# Altium footprint library TranDangKhoa-LIB.PcbLib: 1435 footprints (part 8 of 90)
Each footprint in its own frame and in the unit in brackets; x right, y up, seen from the top. Pads: shape width x height; smd on the part's side, far side on the other; paste and mask are expansions set on the pad; w line width, h text height; cw(c..) or ccw(c..) is an arc to the next point about the centre after c.
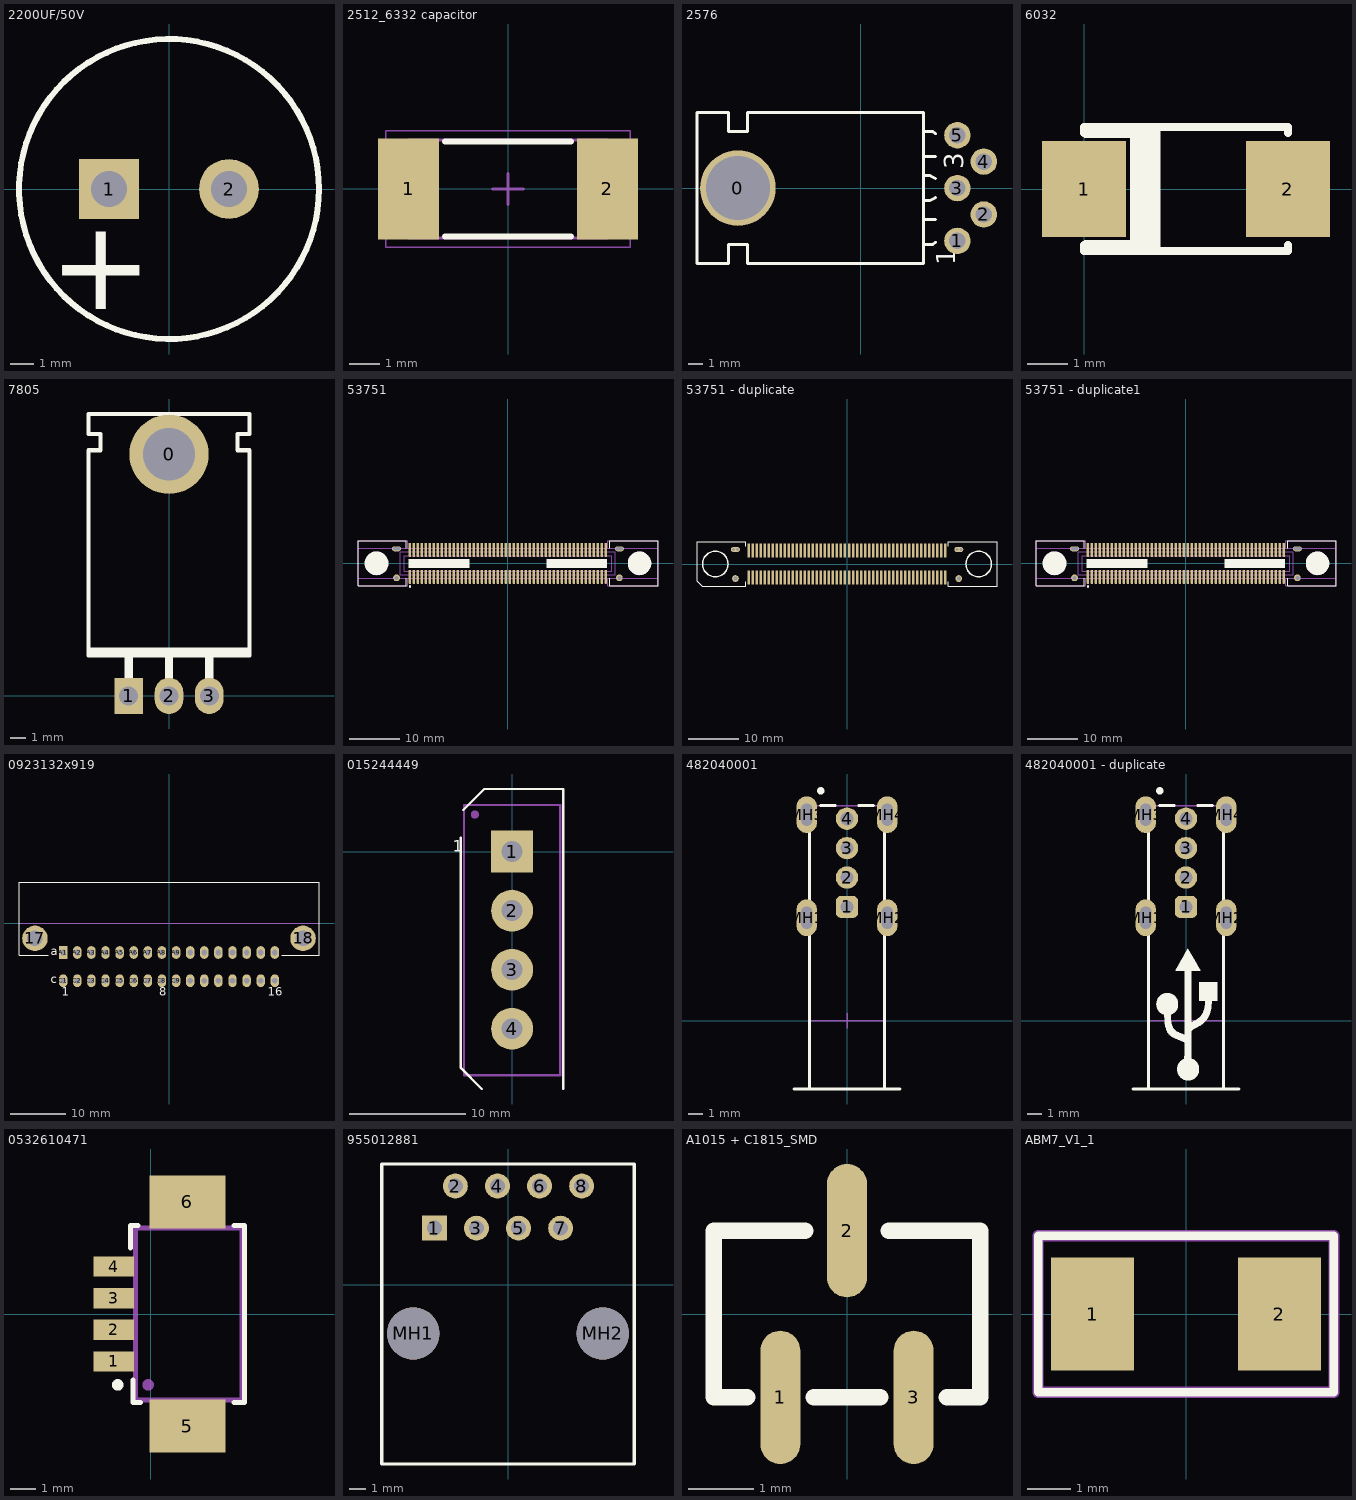
[diagram p7: the footprints below, top view; thin cyan lines are the x and y axes]

## 2200UF/50V [mil]
pads (2):
  rect 100x100 hole 60: 1(-100,0)
  round 100 hole 60: 2(100,0)
Top Overlay:
  circle w10: c0,0 r250
  text "+" at -200,-200 h150

## 2512_6332 capacitor [mm] "Chip Capacitor, 2-Leads, Body 6.50x3.20mm, IPC Medium Density"
height 0.65
pads (2):
  rect 2x3.3 smd: 1(-3.25,0) 2(3.25,0)
Top Overlay:
  lines w0.2: -2.05,-1.55 2.05,-1.55 ; -2.05,1.55 2.05,1.55
Mechanical 13:
  lines w0.1: -3.25,-1.6 -3.25,1.6 3.25,1.6 3.25,-1.6 -3.25,-1.6
Mechanical 15:
  lines w0.05: -4,-1.9 -4,1.9 4,1.9 4,-1.9 -4,-1.9
  lines w0.1: -0.5,0 0.5,0 ; 0,-0.5 0,0.5
3D body: height 0.65, standoff 0, extent -2.45,-1.6 2.45,1.6
3D body: height 0.65, standoff 0, extent -3.25,-1.6 -2.45,1.6
3D body: height 0.65, standoff 0, extent 2.45,-1.6 3.25,1.6

## 2576 [mil]
pads (6):
  round 200 hole 170: 0(-325.83,0)
  round 70 hole 43.31: 1(255.83,-140) 2(325.83,-70) 3(255.83,0) 4(325.83,70) 5(255.83,140)
Top Overlay:
  lines w7.87: 165.83,-150 190.83,-150 ; 165.83,-83.33 198.44,-83.33 ; 165.83,-33.33 182.5,-33.33 198.44,-25 ; 165.83,33.33 182.5,33.33 198.44,25 ; 165.83,83.33 198.44,83.33 ; 165.83,150 190.83,150 ; 189.89,150.31 198.44,143.9 ; 192.09,-148.11 198.44,-143.58 ; -434.17,-200 -434.17,200 -350.84,200 -350.84,150 -300.84,150 -300.84,200 165.83,200 165.83,-200 -300.84,-200 -300.84,-150 -350.84,-150 -350.84,-200 -434.17,-200
  text "3" at 270.83,50 h50
  text "1" at 250.83,-205 h50

## 6032 [mm] "SMD"
height 2.5
pads (2):
  rect 2.1x2.4 smd: 1(0,0) 2(5.08,0)
Top Overlay:
  rectangle: 0,-1.55 1.27,-1.27
  rectangle: 0,1.27 1.27,1.55
  rectangle: 1.143,-1.55 1.905,1.55
  lines w0.2: 0,-1.397 0,-1.55 5.08,-1.55 5.08,-1.397 ; 0,1.397 0,1.55 5.08,1.55 5.08,1.397

## 7805 [mm] "TO, Thru-Hole, Vertical, Heatsink Mounted; 3 In-Line Leads; Pitch 2.54 mm; Pin sequence 1, 3, 2"
height 16.4
pads (4):
  round 5 hole 3.3: 0(0,15.24)
  rect 1.8x2.286 hole 1.2: 1(-2.54,0)
  oval 1.8x2.286 hole 1.2: 2(0,0) 3(2.54,0)
Top Overlay:
  circle w0.203: c0,15.24 r1.27
  rectangle: -0.254,0.762 0.254,2.54
  region: 2.794,2.54 2.286,2.54 2.286,0.762 2.794,0.762
  rectangle: -2.794,0.762 -2.286,2.54
  rectangle: -5.08,2.54 5.08,3.048
  lines w0.254: -5.08,2.54 -5.08,15.494 -4.318,15.494 -4.318,16.51 -5.08,16.51 -5.08,17.78 5.08,17.78 5.08,16.51 4.318,16.51 4.318,15.494 5.08,15.494 5.08,2.54 -5.08,2.54

## 53751 [mm]
pads (104):
  rrect50% 0.508x2.8 smd: 1(-19.6,-2.7) 2(-19.6,2.7) 3(-18.8,-2.7) 4(-18.8,2.7) 5(-18,-2.7) 6(-18,2.7) 7(-17.2,-2.7) 8(-17.2,2.7) 9(-16.4,-2.7) 10(-16.4,2.7) 11(-15.6,-2.7) 12(-15.6,2.7) 13(-14.8,-2.7) 14(-14.8,2.7) 15(-14,-2.7) 16(-14,2.7) 17(-13.2,-2.7) 18(-13.2,2.7) 19(-12.4,-2.7) 20(-12.4,2.7) 21(-11.6,-2.7) 22(-11.6,2.7) 23(-10.8,-2.7) 24(-10.8,2.7) 25(-10,-2.7) 26(-10,2.7) 27(-9.2,-2.7) 28(-9.2,2.7) 29(-8.4,-2.7) 30(-8.4,2.7) 31(-7.6,-2.7) 32(-7.6,2.7) 33(-6.8,-2.7) 34(-6.8,2.7) 35(-6,-2.7) 36(-6,2.7) 37(-5.2,-2.7) 38(-5.2,2.7) 39(-4.4,-2.7) 40(-4.4,2.7) 41(-3.6,-2.7) 42(-3.6,2.7) 43(-2.8,-2.7) 44(-2.8,2.7) 45(-2,-2.7) 46(-2,2.7) 47(-1.2,-2.7) 48(-1.2,2.7) 49(-0.4,-2.7) 50(-0.4,2.7) 51(0.4,-2.7) 52(0.4,2.7) 53(1.2,-2.7) 54(1.2,2.7) 55(2,-2.7) 56(2,2.7) 57(2.8,-2.7) 58(2.8,2.7) 59(3.6,-2.7) 60(3.6,2.7) 61(4.4,-2.7) 62(4.4,2.7) 63(5.2,-2.7) 64(5.2,2.7) 65(6,-2.7) 66(6,2.7) 67(6.8,-2.7) 68(6.8,2.7) 69(7.6,-2.7) 70(7.6,2.7) 71(8.4,-2.7) 72(8.4,2.7) 73(9.2,-2.7) 74(9.2,2.7) 75(10,-2.7) 76(10,2.7) 77(10.8,-2.7) 78(10.8,2.7) 79(11.6,-2.7) 80(11.6,2.7) 81(12.4,-2.7) 82(12.4,2.7) 83(13.2,-2.7) 84(13.2,2.7) 85(14,-2.7) 86(14,2.7) 87(14.8,-2.7) 88(14.8,2.7) 89(15.6,-2.7) 90(15.6,2.7) 91(16.4,-2.7) 92(16.4,2.7) 93(17.2,-2.7) 94(17.2,2.7) 95(18,-2.7) 96(18,2.7) 97(18.8,-2.7) 98(18.8,2.7) 99(19.6,-2.7) 100(19.6,2.7)
  round 1.35 hole 0.8: MH1(-22.283,-2.9) MH3(22.317,-2.9)
  oval 1.8x1 hole 0.6 slot 1.4 at 0 deg: MH2(-22.283,2.9) MH4(22.317,2.9)
Top Overlay:
  circle w2.7: c26.35,0 r1
  circle w2.76: c-26.3,0 r1
  circle w0.25: c-19.6,-4.65 r0.125
  rectangle: -19.85,-0.9 -7.7,0.9
  region: 19.85,0.9 7.7,0.9 7.7,-0.9 19.85,-0.9
  lines w0.2: -20.3,-3 -20.3,-4.5 -30,-4.5 -30,4.5 -20.3,4.5 -20.3,3 ; 20.35,-3 20.35,-4.5 30.05,-4.5 30.05,4.5 20.35,4.5 20.35,3
Mechanical 7:
  circle w0.127: c26.3,0 r2.25
  circle w0.127: c-26.3,0 r2.25
  lines w0.127: -20,-3 -20,-4.5 -30,-4.5 -30,-3 ; -20,3 -20,4.5 -30,4.5 -30,3 ; 20,-3 20,-4.5 30,-4.5 30,-3 ; 20,3 20,4.5 30,4.5 30,3 ; -30,-3 30,-3 ; -30,-3 -30,3 ; -30,3 30,3 ; 30,-3 30,3 ; -21.5,-2.3 21.5,-2.3 21.5,2.3 -21.5,2.3 -21.5,-2.3 ; -20.75,-1.55 -20.75,1.55 20.75,1.55 20.75,-1.55 -20.75,-1.55
3D body "53751 - 1009 Plug.stp": height 11.7, standoff -2.4, extent -30.332,-4.4 30.368,4.4

## 53751 - duplicate [mm] "Connector; Docking Station, Plug; 100 Position; Vertical"
height 7.63
pads (108):
  rect 0.5x2.8 smd: 1(-19.6,-2.7) 2(-19.6,2.7) 3(-18.8,-2.7) 4(-18.8,2.7) 5(-18,-2.7) 6(-18,2.7) 7(-17.2,-2.7) 8(-17.2,2.7) 9(-16.4,-2.7) 10(-16.4,2.7) 11(-15.6,-2.7) 12(-15.6,2.7) 13(-14.8,-2.7) 14(-14.8,2.7) 15(-14,-2.7) 16(-14,2.7) 17(-13.2,-2.7) 18(-13.2,2.7) 19(-12.4,-2.7) 20(-12.4,2.7) 21(-11.6,-2.7) 22(-11.6,2.7) 23(-10.8,-2.7) 24(-10.8,2.7) 25(-10,-2.7) 26(-10,2.7) 27(-9.2,-2.7) 28(-9.2,2.7) 29(-8.4,-2.7) 30(-8.4,2.7) 31(-7.6,-2.7) 32(-7.6,2.7) 33(-6.8,-2.7) 34(-6.8,2.7) 35(-6,-2.7) 36(-6,2.7) 37(-5.2,-2.7) 38(-5.2,2.7) 39(-4.4,-2.7) 40(-4.4,2.7) 41(-3.6,-2.7) 42(-3.6,2.7) 43(-2.8,-2.7) 44(-2.8,2.7) 45(-2,-2.7) 46(-2,2.7) 47(-1.2,-2.7) 48(-1.2,2.7) 49(-0.4,-2.7) 50(-0.4,2.7) 51(0.4,-2.7) 52(0.4,2.7) 53(1.2,-2.7) 54(1.2,2.7) 55(2,-2.7) 56(2,2.7) 57(2.8,-2.7) 58(2.8,2.7) 59(3.6,-2.7) 60(3.6,2.7) 61(4.4,-2.7) 62(4.4,2.7) 63(5.2,-2.7) 64(5.2,2.7) 65(6,-2.7) 66(6,2.7) 67(6.8,-2.7) 68(6.8,2.7) 69(7.6,-2.7) 70(7.6,2.7) 71(8.4,-2.7) 72(8.4,2.7) 73(9.2,-2.7) 74(9.2,2.7) 75(10,-2.7) 76(10,2.7) 77(10.8,-2.7) 78(10.8,2.7) 79(11.6,-2.7) 80(11.6,2.7) 81(12.4,-2.7) 82(12.4,2.7) 83(13.2,-2.7) 84(13.2,2.7) 85(14,-2.7) 86(14,2.7) 87(14.8,-2.7) 88(14.8,2.7) 89(15.6,-2.7) 90(15.6,2.7) 91(16.4,-2.7) 92(16.4,2.7) 93(17.2,-2.7) 94(17.2,2.7) 95(18,-2.7) 96(18,2.7) 97(18.8,-2.7) 98(18.8,2.7) 99(19.6,-2.7) 100(19.6,2.7)
  round 1.35 hole 0.8: MH1(-22.283,-2.9) MH3(22.317,-2.9)
  oval 1.8x1 all layers, no hole: MH2(-22.283,2.9) MH4(22.317,2.9)
  round 0.7 hole 0.6: MH2A(-22.683,2.9) MH2B(-21.883,2.9) MH4A(21.917,2.9) MH4B(22.717,2.9)
Top Overlay:
  circle w0.254: c26.3,0 r2.55
  circle w0.254: c-26.3,0 r2.55
  lines w0.2: -20.253,-4.45 -28.9,-4.45 -29.95,-3.4 -29.95,4.45 -20.25,4.45 -20.25,3.55 ; -20.25,-4.45 -20.25,-3.55 ; 20.25,-3.55 20.25,-4.45 29.95,-4.45 29.95,4.45 20.25,4.45 20.25,3.55
Drill Guide:
  text "Alert PCB fab to slot details" at -20.447,-3.302 h1.5
  text "Slot outline on Mech layer 1" at -19.812,1.778 h1.5
  text "Assign Keep-Out area to slot" at -22.352,-0.762 h1.5
Mechanical 2:
  lines w0.6: -22.683,2.9 -21.883,2.9 ; 21.917,2.9 22.717,2.9

## 53751 - duplicate1 [mm]
pads (104):
  rrect50% 0.508x2.8 smd mask+0: 1(-19.6,-2.7) 3(-18.8,-2.7) 5(-18,-2.7) 95(18,-2.7) 97(18.8,-2.7) 99(19.6,-2.7)
  rrect50% 0.508x2.8 smd: 2(-19.6,2.7) 4(-18.8,2.7) 6(-18,2.7) 7(-17.2,-2.7) 8(-17.2,2.7) 9(-16.4,-2.7) 10(-16.4,2.7) 11(-15.6,-2.7) 12(-15.6,2.7) 13(-14.8,-2.7) 14(-14.8,2.7) 15(-14,-2.7) 16(-14,2.7) 17(-13.2,-2.7) 18(-13.2,2.7) 19(-12.4,-2.7) 20(-12.4,2.7) 21(-11.6,-2.7) 22(-11.6,2.7) 23(-10.8,-2.7) 24(-10.8,2.7) 25(-10,-2.7) 26(-10,2.7) 27(-9.2,-2.7) 28(-9.2,2.7) 29(-8.4,-2.7) 30(-8.4,2.7) 31(-7.6,-2.7) 32(-7.6,2.7) 33(-6.8,-2.7) 34(-6.8,2.7) 35(-6,-2.7) 36(-6,2.7) 37(-5.2,-2.7) 38(-5.2,2.7) 39(-4.4,-2.7) 40(-4.4,2.7) 41(-3.6,-2.7) 42(-3.6,2.7) 43(-2.8,-2.7) 44(-2.8,2.7) 45(-2,-2.7) 46(-2,2.7) 47(-1.2,-2.7) 48(-1.2,2.7) 49(-0.4,-2.7) 50(-0.4,2.7) 51(0.4,-2.7) 52(0.4,2.7) 53(1.2,-2.7) 54(1.2,2.7) 55(2,-2.7) 56(2,2.7) 57(2.8,-2.7) 58(2.8,2.7) 59(3.6,-2.7) 60(3.6,2.7) 61(4.4,-2.7) 62(4.4,2.7) 63(5.2,-2.7) 64(5.2,2.7) 65(6,-2.7) 66(6,2.7) 67(6.8,-2.7) 68(6.8,2.7) 69(7.6,-2.7) 70(7.6,2.7) 71(8.4,-2.7) 72(8.4,2.7) 73(9.2,-2.7) 74(9.2,2.7) 75(10,-2.7) 76(10,2.7) 77(10.8,-2.7) 78(10.8,2.7) 79(11.6,-2.7) 80(11.6,2.7) 81(12.4,-2.7) 82(12.4,2.7) 83(13.2,-2.7) 84(13.2,2.7) 85(14,-2.7) 86(14,2.7) 87(14.8,-2.7) 88(14.8,2.7) 89(15.6,-2.7) 90(15.6,2.7) 91(16.4,-2.7) 92(16.4,2.7) 93(17.2,-2.7) 94(17.2,2.7) 96(18,2.7) 98(18.8,2.7) 100(19.6,2.7)
  round 1.35 hole 0.8 mask+0: MH1(-22.283,-2.9) MH3(22.317,-2.9)
  oval 1.8x1 hole 0.6 slot 1.4 at 0 deg mask+0: MH2(-22.283,2.9) MH4(22.317,2.9)
Top Overlay:
  circle w2.7: c26.35,0 r1
  circle w2.76: c-26.3,0 r1
  circle w0.25: c-19.6,-4.65 r0.125
  rectangle: -19.85,-0.9 -7.7,0.9
  region: 19.85,0.9 7.7,0.9 7.7,-0.9 19.85,-0.9
  lines w0.2: -20.3,-3 -20.3,-4.5 -30,-4.5 -30,4.5 -20.3,4.5 -20.3,3 ; 20.35,-3 20.35,-4.5 30.05,-4.5 30.05,4.5 20.35,4.5 20.35,3
Mechanical 7:
  circle w0.127: c26.3,0 r2.25
  circle w0.127: c-26.3,0 r2.25
  lines w0.127: -20,-3 -20,-4.5 -30,-4.5 -30,-3 ; -20,3 -20,4.5 -30,4.5 -30,3 ; 20,-3 20,-4.5 30,-4.5 30,-3 ; 20,3 20,4.5 30,4.5 30,3 ; -30,-3 30,-3 ; -30,-3 -30,3 ; -30,3 30,3 ; 30,-3 30,3 ; -21.5,-2.3 21.5,-2.3 21.5,2.3 -21.5,2.3 -21.5,-2.3 ; -20.75,-1.55 -20.75,1.55 20.75,1.55 20.75,-1.55 -20.75,-1.55
3D body "53751 - 1009 Plug.stp": height 11.7, standoff -2.4, extent -30.332,-4.4 30.368,4.4

## 0923132x919 [mm] "Connector; DIN 41612, Type 2C, Thru-Hole; Rows a+c, 32 Position; Right Angle"
height 11.1
pads (34):
  round 4.6 hole 2.8: 17(-24.13,-2.76) 18(24.13,-2.76)
  rect 1.524x2.286 hole 1: A1(-19.05,-5.3)
  oval 1.524x2.286 hole 1: A2(-16.51,-5.3) A3(-13.97,-5.3) A4(-11.43,-5.3) A5(-8.89,-5.3) A6(-6.35,-5.3) A7(-3.81,-5.3) A8(-1.27,-5.3) A9(1.27,-5.3) A10(3.81,-5.3) A11(6.35,-5.3) A12(8.89,-5.3) A13(11.43,-5.3) A14(13.97,-5.3) A15(16.51,-5.3) A16(19.05,-5.3) C1(-19.05,-10.38) C2(-16.51,-10.38) C3(-13.97,-10.38) C4(-11.43,-10.38) C5(-8.89,-10.38) C6(-6.35,-10.38) C7(-3.81,-10.38) C8(-1.27,-10.38) C9(1.27,-10.38) C10(3.81,-10.38) C11(6.35,-10.38) C12(8.89,-10.38) C13(11.43,-10.38) C14(13.97,-10.38) C15(16.51,-10.38) C16(19.05,-10.38)
Top Overlay:
  lines w0.2: -21.75,-5.8 -27,-5.8 -27,7.34 27,7.34 27,-5.8 20.275,-5.8
  text "16" at 17.8,-13.08 h1.5
  text "8" at -1.77,-13.08 h1.5
  text "c" at -21.26,-10.88 h1.5
  text "a" at -21.26,-5.8 h1.5
  text "1" at -19.3,-13.08 h1.5
Mechanical 1:
  lines w0.1: -27,0 27,0
  text "PCB Edge" at -26.15,0.5 h0.6

## 015244449 [mm] "Creator MM"
height 10.16
pads (4):
  rect 3.6x3.6 hole 1.8: 1(0,0)
  round 3.6 hole 1.8: 2(0,-5.08) 3(0,-10.16) 4(0,-15.24)
Top Overlay:
  lines w0.2: -4.4,1.2 -4.4,-18.62 -2.6,-20.42 ; -4.2,3.58 -2.4,5.38 4.4,5.38 4.4,-20.42
  text "1" at -5.1,0 h1.02
Mechanical 16:
  circle w0.5: c-3.2,3.18 r0.1
  lines w0.2: -4.14,-19.25 4.14,-19.25 4.14,4.01 -4.14,4.01 -4.14,-19.25
Mechanical 29:
  text ".Designator" at 0.5,-10.02 h1.52
3D body "015244449.stp": height 10.16, standoff -3.6, extent -4.13,-19.25 4.15,4.01

## 482040001 [mm]
pads (8):
  rrect50% 1.52x1.52 hole 0.9: 1(0,7.73)
  round 1.52 hole 0.9: 2(0,9.73) 3(0,11.73) 4(0,13.73)
  oval 1.4x2.5 hole 0.75 slot 1.5 at 90 deg: MH1(-2.735,7) MH2(2.735,7) MH3(-2.735,14) MH4(2.735,14)
Top Overlay:
  circle w0.25: c-1.783,15.621 r0.125
  lines w0.2: -3.6,-4.64 3.6,-4.64 ; -2.56,-4.64 -2.56,5.9 ; -2.56,8.1 -2.56,12.9 ; -1.8,14.61 -0.8,14.61 ; 0.8,14.61 1.8,14.61 ; 2.56,-4.64 2.56,5.9 ; 2.56,8.1 2.56,12.9
Mechanical 1:
  lines w0.1: -2.56,0 2.56,0
  text "PCB Edge" at -1.5,0.3 h0.4
Mechanical 13:
  lines w0.1: -3.6,-4.64 3.6,-4.64 ; -2.56,-4.64 -2.56,14.61 2.56,14.61 2.56,-4.64
Mechanical 15:
  lines w0.1: -0.5,0 0.5,0 ; 0,-0.5 0,0.5
3D body "482040001.stp": height 14.68, standoff -3.61, extent -3.606,-4.713 3.594,14.537

## 482040001 - duplicate [mm]
pads (8):
  rrect50% 1.52x1.52 hole 0.9: 1(0,7.73)
  round 1.52 hole 0.9: 2(0,9.73) 3(0,11.73) 4(0,13.73)
  oval 1.4x2.5 hole 0.75 slot 1.5 at 90 deg: MH1(-2.735,7) MH2(2.735,7) MH3(-2.735,14) MH4(2.735,14)
Top Overlay:
  drawing of 1148 lines, arcs and shapes, not listed
Mechanical 1:
  lines w0.1: -2.56,0 2.56,0
  text "PCB Edge" at -1.5,0.3 h0.4
Mechanical 13:
  lines w0.1: -3.6,-4.64 3.6,-4.64 ; -2.56,-4.64 -2.56,14.61 2.56,14.61 2.56,-4.64
Mechanical 15:
  lines w0.1: -0.5,0 0.5,0 ; 0,-0.5 0,0.5
3D body "482040001.stp": height 14.68, standoff -3.61, extent -3.606,-4.713 3.594,14.537

## 0532610471 [mm] "Creator MM"
height 3.4
pads (6):
  rect 1.6x0.8 smd: 1(-1.45,-1.875) 2(-1.45,-0.625) 3(-1.45,0.625) 4(-1.45,1.875)
  rect 3x2.1 smd: 5(1.45,-4.425) 6(1.45,4.425)
Top Overlay:
  circle w0.254: c-1.3,-2.8 r0.1
  lines w0.2: -0.8,2.6 -0.8,3.5 -0.5,3.5 ; -0.7,-2.6 -0.7,-3.5 -0.4,-3.5 ; 3.3,-3.5 3.7,-3.5 3.7,3.5 3.3,3.5
Mechanical 16:
  circle w0.254: c-0.1,-2.8 r0.1
  lines w0.2: -0.6,-3.4 3.6,-3.4 3.6,3.4 -0.6,3.4 -0.6,-3.4
Mechanical 29:
  text ".Designator" at 2.1,-2 h1.52
3D body "532610471.stp": height 3.39, standoff -0.01, extent -1.6,-5.075 3.6,5.075

## 955012881 [mm]
pads (10):
  rect 1.5x1.5 hole 0.9: 1(-4.445,3.43)
  round 1.5 hole 0.9: 2(-3.175,5.97) 3(-1.905,3.43) 4(-0.635,5.97) 5(0.635,3.43) 6(1.905,5.97) 7(3.175,3.43) 8(4.445,5.97)
  round 3.15 hole 3.15 unplated: MH1(-5.715,-2.92) MH2(5.715,-2.92)
Top Overlay:
  lines w0.2: -7.62,-10.8 7.62,-10.8 7.62,7.3 -7.62,7.3 -7.62,-10.8
Mechanical 13:
  lines w0.1: -7.62,-10.8 7.62,-10.8 ; -7.62,-10 -7.62,7.3 7.62,7.3 7.62,-10
3D body "RJ45cat5step.stp": height 23.16, standoff -3.49, extent -5.94,-145.722 5.74,1.647
3D body: height 11.5, standoff 10.67, extent -7.529,-11.313 7.457,6.892
3D body: height 1.78, standoff 0, extent -6.977,-11.508 -3.506,-10.35
3D body: height 1.78, standoff 0, extent 3.38,-11.47 6.798,-10.312
3D body: height 11.5, standoff 0.03, extent -7.534,5.765 7.467,7.035
3D body: height 7, standoff 0, extent -7.411,2.03 7.512,6.539
3D body: height 10.16, standoff 9.91, extent -4.8,-7.118 -4.083,5.101
3D body: height 10.16, standoff 9.91, extent -3.554,-7.115 -2.837,5.104
3D body: height 10.16, standoff 9.91, extent -2.266,-7.13 -1.549,5.089
3D body: height 10.16, standoff 9.91, extent -1.009,-7.161 -0.293,5.058
3D body: height 10.16, standoff 9.91, extent 0.201,-7.161 0.918,5.058
3D body: height 10.16, standoff 9.91, extent 1.504,-7.115 2.221,5.104
3D body: height 10.16, standoff 9.91, extent 2.808,-7.13 3.524,5.089
3D body: height 10.16, standoff 9.91, extent 4.111,-7.13 4.828,5.089
3D body: height 11.5, standoff 0.03, extent 6.401,-11.442 7.436,6.768
3D body: height 11.4, standoff 0.03, extent -7.44,-11.501 -6.407,6.777
3D body: height 0.3, standoff -3, extent -7.273,-4.488 -4.155,-1.37
3D body: height 10.16, standoff 0.1, extent 2.827,4.323 3.56,5.056
3D body: height 10.16, standoff 0.1, extent 4.123,4.323 4.856,5.056
3D body: height 0.3, standoff -3, extent 4.167,-4.496 7.286,-1.378
3D body: height 10.16, standoff 0.1, extent 1.544,4.309 2.277,5.042
3D body: height 10.16, standoff 0.1, extent 0.243,4.318 0.976,5.051
3D body: height 10.16, standoff 0.1, extent -1.021,4.296 -0.289,5.029
3D body: height 10.16, standoff 0.1, extent -2.255,4.341 -1.522,5.074
3D body: height 10.16, standoff 0.1, extent -3.569,4.327 -2.836,5.06
3D body: height 10.16, standoff 0.1, extent -4.802,4.327 -4.069,5.06
3D body: height 2.54, standoff -2, extent 4.089,5.602 4.822,6.335
3D body: height 2.54, standoff -2, extent 1.53,5.599 2.263,6.331
3D body: height 2.54, standoff -2, extent -0.992,5.594 -0.259,6.327
3D body: height 2.54, standoff -2, extent -3.549,5.594 -2.816,6.327
3D body: height 10.16, standoff -2, extent -4.822,3.048 -4.089,3.781
3D body: height 10.16, standoff -2, extent -2.289,3.053 -1.556,3.786
3D body: height 10.16, standoff -2, extent 0.258,3.055 0.991,3.788
3D body: height 10.16, standoff -2, extent 2.815,3.048 3.548,3.781
3D body: height 1, standoff 0.03, extent -7.397,-11.451 7.169,6.845

## A1015 + C1815_SMD [mil]
pads (3):
  oval 24x80 smd: 1(-40,-50) 2(0,50) 3(40,-50)
Top Overlay:
  lines w10: -60,-50 -80,-50 -80,50 -60,50 -25,50 ; -20,-50 20,-50 ; 25,50 80,50 80,-50 60,-50

## ABM7_V1_1 [mm] "Corrected from 2.2 to 2.4 between pads"
pads (2):
  rect 1.9x2.6 smd: 1(-2.15,0) 2(2.15,0)
Top Overlay:
  lines w0.2: -3.4,-1.8 -3.4,1.8 3.4,1.8 3.4,-1.8 -3.4,-1.8
Mechanical 16:
  lines w0.254: -3.4,-1.8 -3.4,1.8 3.4,1.8 3.4,-1.8 -3.4,-1.8
Mechanical 29:
  text ".Designator" at 0.9,0.6 h1.52
3D body "Xtal-ABM7.STEP": height 1.44, standoff 0.04, extent -3.1,-1.85 3.1,1.85
3D body: height 1.45, standoff 1.4, extent -2,-1.3 2,1.5